# Altium footprint library 贴片电感.PcbLib: 92 footprints (part 5 of 6)
Each footprint in its own frame and in the unit in brackets; x right, y up, seen from the top. Pads: shape width x height; smd on the part's side, far side on the other; paste and mask are expansions set on the pad; w line width, h text height; cw(c..) or ccw(c..) is an arc to the next point about the centre after c.
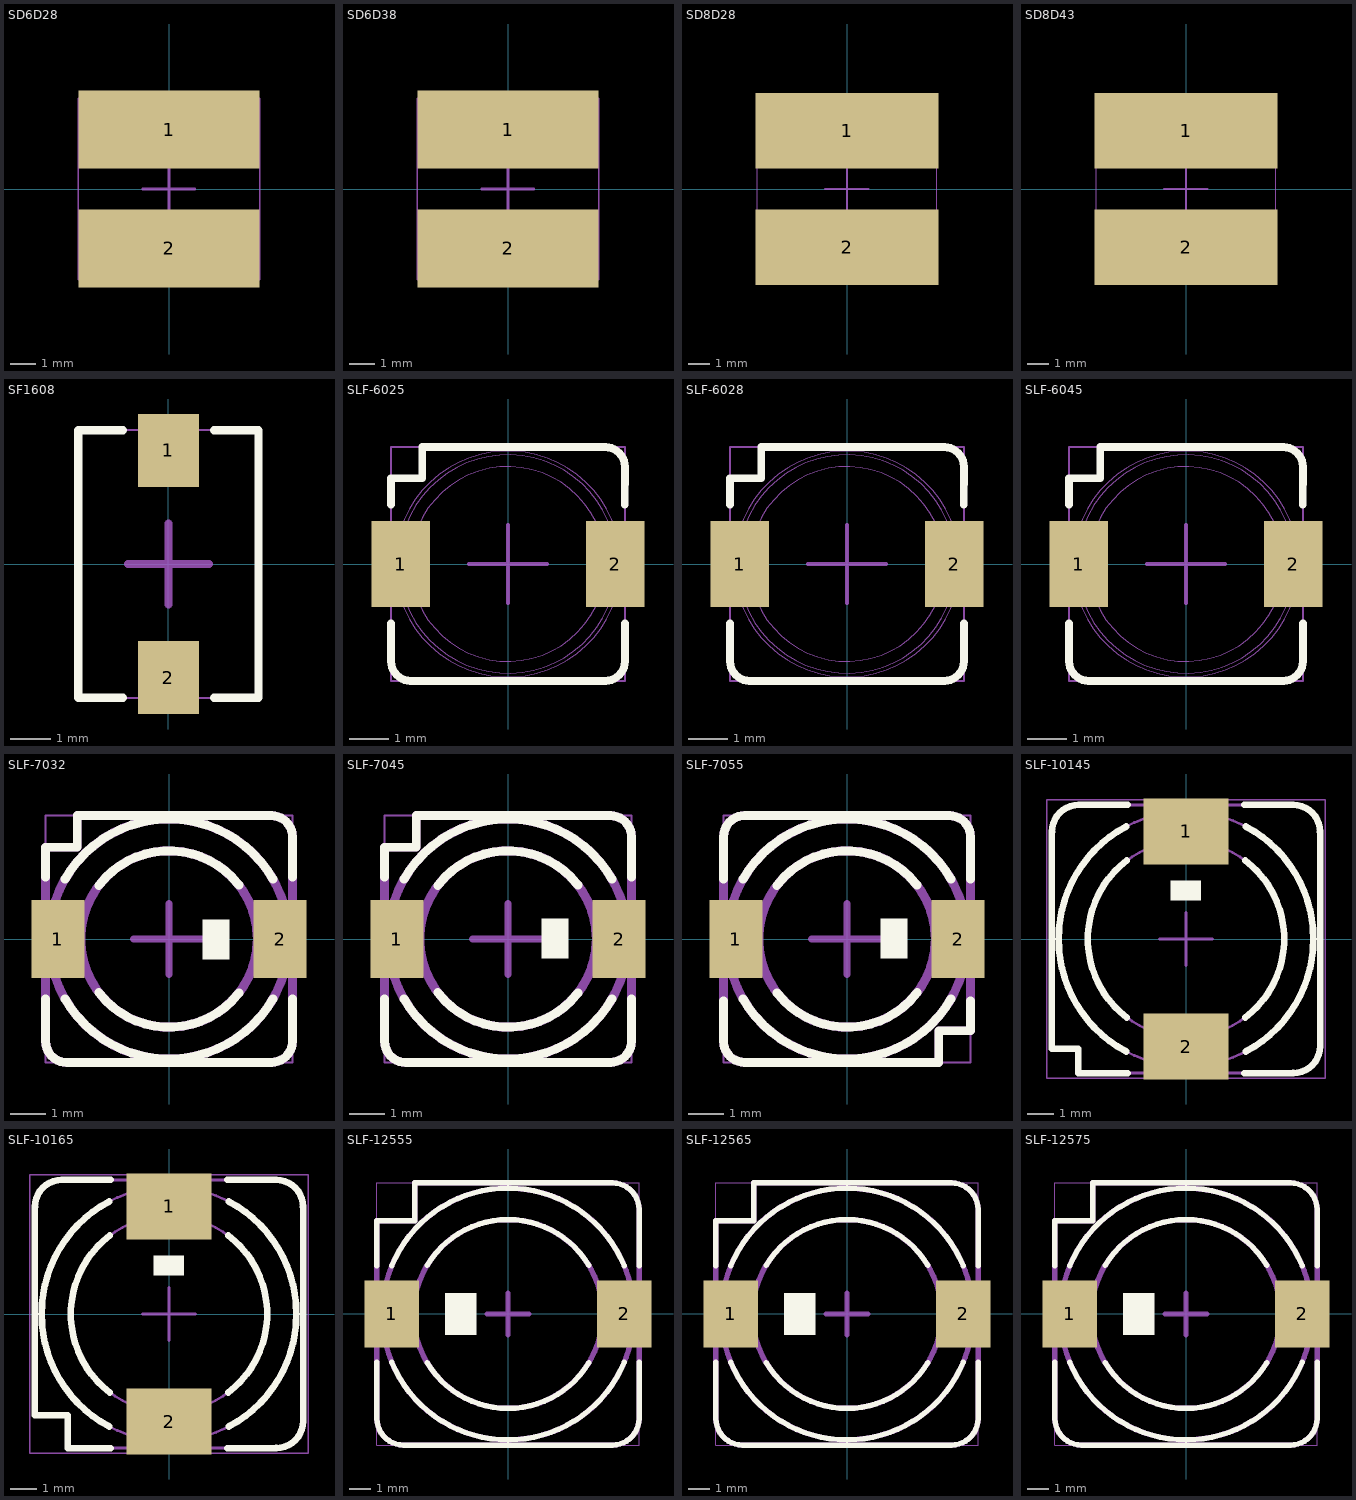
[diagram p4: the footprints below, top view; thin cyan lines are the x and y axes]

## SD6D28 [mm] "贴片蔽磁电感"
height 3
pads (2):
  rect 7x3 smd: 1(0,2.3) 2(0,-2.3)
Mechanical 13:
  lines w0.05: -3.5,-3.5 -3.5,3.5 3.5,3.5 3.5,-3.5 -3.5,-3.5
Mechanical 15:
  lines w0.1: -1.016,0 1,0 ; 0,-1 0,1
3D body: height 3, standoff 0, extent -3.5,-3.5 3.5,3.5

## SD6D38 [mm] "贴片蔽磁电感"
height 4
pads (2):
  rect 7x3 smd: 1(0,2.3) 2(0,-2.3)
Mechanical 13:
  lines w0.05: -3.5,-3.5 -3.5,3.5 3.5,3.5 3.5,-3.5 -3.5,-3.5
Mechanical 15:
  lines w0.1: -1.016,0 1,0 ; 0,-1 0,1
3D body: height 4, standoff 0, extent -3.5,-3.5 3.5,3.5

## SD8D28 [mm] "贴片蔽磁电感"
height 3
pads (2):
  rect 8.5x3.5 smd: 1(0,2.7) 2(0,-2.7)
Mechanical 13:
  lines w0.05: -4.15,-4.15 4.15,-4.15 4.15,4.15 -4.15,4.15 -4.15,-4.15
Mechanical 15:
  lines w0.1: -1.016,0 1,0 ; 0,-1 0,1
3D body: height 3, standoff 0, extent -4.15,-4.15 4.15,4.15

## SD8D43 [mm] "贴片蔽磁电感"
height 4.5
pads (2):
  rect 8.5x3.5 smd: 1(0,2.7) 2(0,-2.7)
Mechanical 13:
  lines w0.05: -4.15,-4.15 4.15,-4.15 4.15,4.15 -4.15,4.15 -4.15,-4.15
Mechanical 15:
  lines w0.1: -1.016,0 1,0 ; 0,-1 0,1
3D body: height 4.5, standoff 0, extent -4.15,-4.15 4.15,4.15

## SF1608 [mm] "贴片工字电感"
height 2.92
pads (2):
  rect 1.5x1.8 smd: 1(0,2.8) 2(0,-2.8)
Top Overlay:
  lines w0.2: -1.125,-3.3 -2.225,-3.3 -2.225,3.3 -1.125,3.3 ; 1.125,-3.3 2.225,-3.3 2.225,3.3 1.125,3.3
Mechanical 13:
  lines w0.05: -2.198,-3.304 2.25,-3.304 2.25,3.3 -2.198,3.3 -2.198,-3.304
Mechanical 15:
  lines w0.2: -1,0 1,0 ; 0,-1 0,1
3D body: height 2.98, standoff 0.05, extent -2.198,-3.304 2.25,3.3

## SLF-6025 [mm] "TDK 蔽磁贴片功率电感"
height 4.5
pads (2):
  rect 1.5x2.2 smd: 1(-2.75,0) 2(2.75,0)
Top Overlay:
  lines w0.2: -3,-1.524 -3,-2.5 ccw(c-2.5,-2.5) -2.5,-3 2.5,-3 ccw(c2.5,-2.5) 3,-2.5 3,-1.524 ; -3,1.524 -3,2.2 -2.2,2.2 -2.2,3 2.5,3 cw(c2.5,2.5) 3,2.5 2.997,1.524
Mechanical 13:
  lines w0.05: -3,-3 -3,3 3,3 3,-3 -3,-3
Mechanical 15:
  circle w0.001: c0,0 r2.9
  circle w0.001: c0,0 r2.8
  circle w0.001: c0,0 r2.5
  lines w0.001: -3,-1.1 -3,-2.5 ccw(c-2.5,-2.5) -2.5,-3 2.5,-3 ccw(c2.5,-2.5) 3,-2.5 3,-1.1 ; -3,1.1 -3,2.2 -2.2,2.2 -2.2,3 2.5,3 cw(c2.5,2.5) 3,2.5 3,1.1
  lines w0.1: -1,0 0,0 ; 0,-1 0,0 ; 0,1 0,0 ; 1,0 0,0
3D body: height 2.51, standoff 0, extent -3,-3 3,3

## SLF-6028 [mm] "TDK 蔽磁贴片功率电感"
height 2.8
pads (2):
  rect 1.5x2.2 smd: 1(-2.75,0) 2(2.75,0)
Top Overlay:
  lines w0.2: -3,-1.524 -3,-2.5 ccw(c-2.5,-2.5) -2.5,-3 2.5,-3 ccw(c2.5,-2.5) 3,-2.5 3,-1.524 ; -3,1.524 -3,2.2 -2.2,2.2 -2.2,3 2.5,3 cw(c2.5,2.5) 3,2.5 2.997,1.524
Mechanical 13:
  lines w0.05: -3,-3 -3,3 3,3 3,-3 -3,-3
Mechanical 15:
  circle w0.001: c0,0 r2.9
  circle w0.001: c0,0 r2.8
  circle w0.001: c0,0 r2.5
  lines w0.001: -3,-1.1 -3,-2.5 ccw(c-2.5,-2.5) -2.5,-3 2.5,-3 ccw(c2.5,-2.5) 3,-2.5 3,-1.1 ; -3,1.1 -3,2.2 -2.2,2.2 -2.2,3 2.5,3 cw(c2.5,2.5) 3,2.5 3,1.1
  lines w0.1: -1,0 0,0 ; 0,-1 0,0 ; 0,1 0,0 ; 1,0 0,0
3D body: height 2.81, standoff 0, extent -3,-3 3,3

## SLF-6045 [mm] "TDK 蔽磁贴片功率电感"
height 4.5
pads (2):
  rect 1.5x2.2 smd: 1(-2.75,0) 2(2.75,0)
Top Overlay:
  lines w0.2: -3,-1.524 -3,-2.5 ccw(c-2.5,-2.5) -2.5,-3 2.5,-3 ccw(c2.5,-2.5) 3,-2.5 3,-1.524 ; -3,1.524 -3,2.2 -2.2,2.2 -2.2,3 2.5,3 cw(c2.5,2.5) 3,2.5 2.997,1.524
Mechanical 13:
  lines w0.05: -3,-3 3,-3 3,3 -3,3 -3,-3
Mechanical 15:
  circle w0.001: c0,0 r2.5
  circle w0.001: c0,0 r2.8
  circle w0.001: c0,0 r2.9
  lines w0.001: -3,-1.1 -3,-2.5 ccw(c-2.5,-2.5) -2.5,-3 2.5,-3 ccw(c2.5,-2.5) 3,-2.5 3,-1.1 ; -3,1.1 -3,2.2 -2.2,2.2 -2.2,3 2.5,3 cw(c2.5,2.5) 3,2.5 3,1.1
  lines w0.1: -1,0 0,0 ; 0,-1 0,0 ; 0,1 0,0 ; 1,0 0,0
3D body: height 4.51, standoff 0, extent -3,-3 3,3

## SLF-7032 [mm] "TDK 蔽磁贴片功率电感"
height 3.2
pads (2):
  rect 1.5x2.2 smd: 1(-3.15,0) 2(3.15,0)
Top Overlay:
  region: 1.71,0.559 0.948,0.559 0.948,-0.584 1.71,-0.584
  lines w0.25: -3.5,-2.896 -3.5,-1.702 ; -3.5,1.753 -3.5,2.6 -2.6,2.6 -2.6,3.5 2.896,3.5 ; -3.496,-2.9 ccw(c-2.896,-2.9) -2.896,-3.5 2.896,-3.5 ; -2.944,-1.7 ccw(c0,0) 2.944,-1.7 ; -2.944,1.7 cw(c0,0) 2.944,1.7 ; 2.9,-3.496 ccw(c2.9,-2.896) 3.5,-2.896 3.5,-1.702 ; 2.9,3.496 cw(c2.9,2.896) 3.5,2.896 3.5,1.753
  lines w0.254: -1.991,-1.512 ccw(c0,0) 1.979,-1.528 ; -1.991,1.512 cw(c0,0) 1.979,1.528
Mechanical 13:
  lines w0.05: -3.5,-3.5 3.5,-3.5 3.5,3.5 -3.5,3.5 -3.5,-3.5
Mechanical 15:
  circle w0.25: c0,0 r3.4
  circle w0.254: c0,0 r2.5
  lines w0.2: -1,0 1,0 ; 0,-1 0,1
  lines w0.25: -3.5,-2.896 -3.5,2.6 -2.6,2.6 -2.6,3.5 2.896,3.5 ; -3.496,-2.9 ccw(c-2.896,-2.9) -2.896,-3.5 2.896,-3.5 ; 2.9,-3.496 ccw(c2.9,-2.896) 3.5,-2.896 3.5,2.896 ccw(c2.9,2.896) 2.9,3.496
3D body: height 3.31, standoff 0.1, extent -3.5,-3.5 3.5,3.5

## SLF-7045 [mm] "TDK 蔽磁贴片功率电感"
height 4.5
pads (2):
  rect 1.5x2.2 smd: 1(-3.15,0) 2(3.15,0)
Top Overlay:
  region: 1.71,0.584 0.948,0.584 0.948,-0.559 1.71,-0.559
  lines w0.25: -3.5,-2.896 -3.5,-1.702 ; -3.5,1.753 -3.5,2.6 -2.6,2.6 -2.6,3.5 2.896,3.5 ; -3.496,-2.9 ccw(c-2.896,-2.9) -2.896,-3.5 2.896,-3.5 ; -2.944,-1.7 ccw(c0,0) 2.944,-1.7 ; -2.944,1.7 cw(c0,0) 2.944,1.7 ; 2.9,-3.496 ccw(c2.9,-2.896) 3.5,-2.896 3.5,-1.702 ; 2.9,3.496 cw(c2.9,2.896) 3.5,2.896 3.5,1.753
  lines w0.254: -1.991,-1.512 ccw(c0,0) 1.979,-1.528 ; -1.991,1.512 cw(c0,0) 1.979,1.528
Mechanical 13:
  lines w0.05: -3.5,-3.5 -3.5,3.5 3.5,3.5 3.5,-3.5 -3.5,-3.5
Mechanical 15:
  circle w0.254: c0,0 r2.5
  circle w0.25: c0,0 r3.4
  lines w0.2: -1,0 1,0 ; 0,-1 0,1
  lines w0.25: -3.5,-2.896 -3.5,2.6 -2.6,2.6 -2.6,3.5 2.896,3.5 ; -3.496,-2.9 ccw(c-2.896,-2.9) -2.896,-3.5 2.896,-3.5 ; 2.9,-3.496 ccw(c2.9,-2.896) 3.5,-2.896 3.5,2.896 ccw(c2.9,2.896) 2.9,3.496
3D body: height 4.61, standoff 0.1, extent -3.5,-3.5 3.5,3.5

## SLF-7055 [mm] "TDK 蔽磁贴片功率电感"
height 5.5
pads (2):
  rect 1.5x2.2 smd: 1(-3.15,0) 2(3.15,0)
Top Overlay:
  region: 1.71,0.584 0.948,0.584 0.948,-0.559 1.71,-0.559
  lines w0.25: -3.5,-1.753 -3.5,-2.896 ccw(c-2.9,-2.896) -2.9,-3.496 ; -3.5,1.702 -3.5,2.896 ; -3.496,2.9 cw(c-2.896,2.9) -2.896,3.5 2.896,3.5 ; -2.944,-1.7 ccw(c0,0) 2.944,-1.7 ; -2.944,1.7 cw(c0,0) 2.944,1.7 ; -2.896,-3.5 2.6,-3.5 2.6,-2.6 3.5,-2.6 3.5,-1.753 ; 2.9,3.496 cw(c2.9,2.896) 3.5,2.896 3.5,1.702
  lines w0.254: -1.991,1.512 cw(c0,0) 1.979,1.528 ; -1.979,-1.528 ccw(c0,0) 1.991,-1.512
Mechanical 13:
  lines w0.05: -3.5,-3.5 -3.5,3.5 3.5,3.5 3.5,-3.5 -3.5,-3.5
Mechanical 15:
  circle w0.254: c0,0 r2.5
  circle w0.25: c0,0 r3.4
  lines w0.2: -1,0 1,0 ; 0,-1 0,1
  lines w0.25: -3.5,2.896 -3.5,-2.896 ccw(c-2.9,-2.896) -2.9,-3.496 ; -3.496,2.9 cw(c-2.896,2.9) -2.896,3.5 2.896,3.5 ; -2.896,-3.5 2.6,-3.5 2.6,-2.6 3.5,-2.6 3.5,2.896 ccw(c2.9,2.896) 2.9,3.496
3D body: height 5.61, standoff 0.1, extent -3.5,-3.5 3.5,3.5

## SLF-10145 [mm] "TDK 蔽磁贴片功率电感"
height 4.5
pads (2):
  rect 3.2x2.5 smd: 1(0,4.05) 2(0,-4.05)
Top Overlay:
  region: -0.584,2.21 -0.584,1.448 0.559,1.448 0.559,2.21
  lines w0.25: -2.253,-4.238 cw(c0,0) -2.253,4.238 ; -2.227,-2.955 cw(c0,0) -2.227,2.955 ; -2.2,-5.05 -4.064,-5.05 -4.064,-4.14 -5.05,-4.14 -5.05,4.039 cw(c-4.039,4.039) -4.039,5.05 -2.2,5.05 ; 2.2,-5.05 4.039,-5.05 ccw(c4.039,-4.039) 5.05,-4.039 5.05,4.039 ccw(c4.039,4.039) 4.039,5.05 2.2,5.05 ; 2.227,-2.955 ccw(c0,0) 2.227,2.955 ; 2.253,-4.238 ccw(c0,0) 2.253,4.238
Mechanical 13:
  lines w0.05: -5.25,-5.25 5.25,-5.25 5.25,5.25 -5.25,5.25 -5.25,-5.25
Mechanical 15:
  circle w0.1: c0,0 r3.7
  circle w0.1: c0,0 r4.8
  lines w0.1: -1,0 1,0 ; 0,-1 0,1 ; -5.05,-4.14 -5.05,4.039 cw(c-4.039,4.039) -4.039,5.05 4.039,5.05 cw(c4.039,4.039) 5.05,4.039 5.05,-4.039 cw(c4.039,-4.039) 4.039,-5.05 -4.064,-5.05 -4.064,-4.14 -5.05,-4.14
3D body: height 4.6, standoff 0.1, extent -5.25,-5.25 5.25,5.25

## SLF-10165 [mm] "TDK 蔽磁贴片功率电感"
height 6.5
pads (2):
  rect 3.2x2.5 smd: 1(0,4.05) 2(0,-4.05)
Top Overlay:
  region: -0.584,2.21 -0.584,1.448 0.559,1.448 0.559,2.21
  lines w0.25: -2.253,-4.238 cw(c0,0) -2.253,4.238 ; -2.227,-2.955 cw(c0,0) -2.227,2.955 ; -2.2,-5.05 -3.81,-5.05 -3.81,-3.81 -5.05,-3.81 -5.05,4.039 cw(c-4.039,4.039) -4.039,5.05 -2.2,5.05 ; 2.2,-5.05 4.039,-5.05 ccw(c4.039,-4.039) 5.05,-4.039 5.05,4.039 ccw(c4.039,4.039) 4.039,5.05 2.2,5.05 ; 2.227,-2.955 ccw(c0,0) 2.227,2.955 ; 2.253,-4.238 ccw(c0,0) 2.253,4.238
Mechanical 13:
  lines w0.05: -5.25,-5.25 5.25,-5.25 5.25,5.25 -5.25,5.25 -5.25,-5.25
Mechanical 15:
  circle w0.1: c0,0 r3.7
  circle w0.1: c0,0 r4.8
  lines w0.1: -1,0 1,0 ; 0,-1 0,1 ; -5.05,-3.81 -5.05,4.039 cw(c-4.039,4.039) -4.039,5.05 4.039,5.05 cw(c4.039,4.039) 5.05,4.039 5.05,-4.039 cw(c4.039,-4.039) 4.039,-5.05 -3.81,-5.05 -3.81,-3.81 -5.05,-3.81
3D body: height 6.61, standoff 0.1, extent -5.25,-5.25 5.25,5.25

## SLF-12555 [mm] "TDK 蔽磁贴片功率电感"
height 5.5
pads (2):
  rect 2.6x3.2 smd: 1(-5.55,0) 2(5.55,0)
Top Overlay:
  rectangle: -3,-1 -1.5,1
  lines w0.254: -6.25,-4.928 -6.25,-4.98 ; -6.25,-2.3 -6.25,-4.98 ; -6.25,2.3 -6.25,4.45 -4.45,4.45 -4.45,6.25 4.98,6.25 cw(c4.98,4.98) 6.25,4.98 6.25,2.3 ; -5.539,-2.306 ccw(c0,0) 5.539,-2.306 ; -5.539,2.306 cw(c0,0) 5.539,2.306 ; -4.877,-6.25 -4.98,-6.25 ; -3.857,-2.318 ccw(c0,0) 3.857,-2.318 ; -3.857,2.318 cw(c0,0) 3.857,2.318 ; 6.25,-2.3 6.25,-4.98 cw(c4.98,-4.98) 4.98,-6.25 -4.98,-6.25 ; -6.25,-4.98 ccw(c-4.98,-4.98) -4.98,-6.25
Mechanical 13:
  lines w0.05: -6.252,-6.25 6.248,-6.25 6.248,6.25 -6.252,6.25 -6.252,-6.25
Mechanical 15:
  circle w0.254: c0,0 r6
  circle w0.254: c0,0 r4.5
  lines w0.254: -6.25,-4.928 -6.25,-4.98 ; -4.877,-6.25 -4.98,-6.25 ; -1,0 1,0 ; 0,-1 0,1 ; -6.25,-4.98 ccw(c-4.98,-4.98) -4.98,-6.25 ; -6.25,-4.98 -6.25,4.45 -4.45,4.45 -4.45,6.25 4.98,6.25 cw(c4.98,4.98) 6.25,4.98 6.25,-4.98 cw(c4.98,-4.98) 4.98,-6.25 -4.98,-6.25
3D body: height 5.51, standoff 0, extent -6.252,-6.25 6.248,6.25

## SLF-12565 [mm] "TDK 蔽磁贴片功率电感"
height 6.5
pads (2):
  rect 2.6x3.2 smd: 1(-5.55,0) 2(5.55,0)
Top Overlay:
  rectangle: -3,-1 -1.5,1
  lines w0.254: -6.25,-4.928 -6.25,-4.98 ; -6.25,-2.3 -6.25,-4.98 ; -6.25,2.3 -6.25,4.45 -4.45,4.45 -4.45,6.25 4.98,6.25 cw(c4.98,4.98) 6.25,4.98 6.25,2.3 ; -5.539,-2.306 ccw(c0,0) 5.539,-2.306 ; -5.539,2.306 cw(c0,0) 5.539,2.306 ; -4.877,-6.25 -4.98,-6.25 ; -3.857,-2.318 ccw(c0,0) 3.857,-2.318 ; -3.857,2.318 cw(c0,0) 3.857,2.318 ; 6.25,-2.3 6.25,-4.98 cw(c4.98,-4.98) 4.98,-6.25 -4.98,-6.25 ; -6.25,-4.98 ccw(c-4.98,-4.98) -4.98,-6.25
Mechanical 13:
  lines w0.05: -6.252,-6.25 6.248,-6.25 6.248,6.25 -6.252,6.25 -6.252,-6.25
Mechanical 15:
  circle w0.254: c0,0 r6
  circle w0.254: c0,0 r4.5
  lines w0.254: -6.25,-4.928 -6.25,-4.98 ; -4.877,-6.25 -4.98,-6.25 ; -1,0 1,0 ; 0,-1 0,1 ; -6.25,-4.98 ccw(c-4.98,-4.98) -4.98,-6.25 ; -6.25,-4.98 -6.25,4.45 -4.45,4.45 -4.45,6.25 4.98,6.25 cw(c4.98,4.98) 6.25,4.98 6.25,-4.98 cw(c4.98,-4.98) 4.98,-6.25 -4.98,-6.25
3D body: height 6.51, standoff 0, extent -6.252,-6.25 6.248,6.25

## SLF-12575 [mm] "TDK 蔽磁贴片功率电感"
height 7.5
pads (2):
  rect 2.6x3.2 smd: 1(-5.55,0) 2(5.55,0)
Top Overlay:
  rectangle: -3,-1 -1.5,1
  lines w0.254: -6.25,-4.928 -6.25,-4.98 ; -6.25,-2.3 -6.25,-4.98 ; -6.25,2.3 -6.25,4.45 -4.45,4.45 -4.45,6.25 4.98,6.25 cw(c4.98,4.98) 6.25,4.98 6.25,2.3 ; -5.539,-2.306 ccw(c0,0) 5.539,-2.306 ; -5.539,2.306 cw(c0,0) 5.539,2.306 ; -4.877,-6.25 -4.98,-6.25 ; -3.857,-2.318 ccw(c0,0) 3.857,-2.318 ; -3.857,2.318 cw(c0,0) 3.857,2.318 ; 6.25,-2.3 6.25,-4.98 cw(c4.98,-4.98) 4.98,-6.25 -4.98,-6.25 ; -6.25,-4.98 ccw(c-4.98,-4.98) -4.98,-6.25
Mechanical 13:
  lines w0.05: -6.252,-6.25 6.248,-6.25 6.248,6.25 -6.252,6.25 -6.252,-6.25
Mechanical 15:
  circle w0.254: c0,0 r6
  circle w0.254: c0,0 r4.5
  lines w0.254: -6.25,-4.928 -6.25,-4.98 ; -4.877,-6.25 -4.98,-6.25 ; -1,0 1,0 ; 0,-1 0,1 ; -6.25,-4.98 ccw(c-4.98,-4.98) -4.98,-6.25 ; -6.25,-4.98 -6.25,4.45 -4.45,4.45 -4.45,6.25 4.98,6.25 cw(c4.98,4.98) 6.25,4.98 6.25,-4.98 cw(c4.98,-4.98) 4.98,-6.25 -4.98,-6.25
3D body: height 7.5, standoff 0, extent -6.252,-6.25 6.248,6.25